# Altium footprint library ref-packages-longpad.PCBLIB: 1527 footprints (part 83 of 103) (continued)
## SQFP-S-44X44-576 [mm] (continued)
Top Overlay:
  circle w0.254: c-19.7,-20.2 r0.75
  lines w0.203: -21.77,-21.76 21.76,-21.76 21.76,21.76 -21.77,21.76 -21.77,-21.76
Mechanical 16:
  drawing of 580 lines, arcs and shapes, not listed
Mechanical 27:
  lines w0.2: -24.4,-24.4 -24.4,24.4 24.4,24.4 24.4,-24.4 -24.4,-24.4

## SSIP-32 [mil]
pads (32):
  round 60 hole 32: 1(-775,100) 2(-725,0) 3(-675,100) 4(-625,0) 5(-575,100) 6(-525,0) 7(-475,100) 8(-425,0) 9(-375,100) 10(-325,0) 11(-275,100) 12(-225,0) 13(-175,100) 14(-125,0) 15(-75,100) 16(-25,0) 17(25,100) 18(75,0) 19(125,100) 20(175,0) 21(225,100) 22(275,0) 23(325,100) 24(375,0) 25(425,100) 26(475,0) 27(525,100) 28(575,0) 29(625,100) 30(675,0) 31(725,100) 32(775,0)
Top Overlay:
  lines w8: -821,175 -821,190 -811,261 811,261 821,193 821,170 796,92
Mechanical 16:
  lines w1: -747,94 -747,259 ; -676,94 -676,257 ; 676,95 676,258 ; 747,94 747,259
  lines w8: -821,175 -796,92 796,92
  lines w22: -725,0 -725,85 ; -625,0 -625,85 ; -525,0 -525,85 ; -425,0 -425,85 ; -325,0 -325,85 ; -225,0 -225,85 ; -125,0 -125,85 ; -25,0 -25,85 ; 75,0 75,85 ; 175,0 175,85 ; 275,0 275,85 ; 375,0 375,85 ; 475,0 475,85 ; 575,0 575,85 ; 675,0 675,85 ; 775,0 775,85

## SSO48 [mm]
pads (48):
  rect 0.4x2.2 smd: 1(-7.303,-4.7) 2(-6.668,-4.7) 3(-6.033,-4.7) 4(-5.398,-4.7) 5(-4.763,-4.7) 6(-4.128,-4.7) 7(-3.493,-4.7) 8(-2.858,-4.7) 9(-2.223,-4.7) 10(-1.588,-4.7) 11(-0.953,-4.7) 12(-0.318,-4.7) 13(0.318,-4.7) 14(0.953,-4.7) 15(1.588,-4.7) 16(2.223,-4.7) 17(2.858,-4.7) 18(3.493,-4.7) 19(4.128,-4.7) 20(4.763,-4.7) 21(5.398,-4.7) 22(6.033,-4.7) 23(6.668,-4.7) 24(7.303,-4.7) 25(7.303,4.7) 26(6.668,4.7) 27(6.033,4.7) 28(5.398,4.7) 29(4.763,4.7) 30(4.128,4.7) 31(3.493,4.7) 32(2.858,4.7) 33(2.223,4.7) 34(1.588,4.7) 35(0.953,4.7) 36(0.318,4.7) 37(-0.318,4.7) 38(-0.953,4.7) 39(-1.588,4.7) 40(-2.223,4.7) 41(-2.858,4.7) 42(-3.493,4.7) 43(-4.128,4.7) 44(-4.763,4.7) 45(-5.398,4.7) 46(-6.033,4.7) 47(-6.668,4.7) 48(-7.303,4.7)
Mechanical 16:
  rectangle: -7.453,-5.33 -7.152,-3.8
  rectangle: -6.818,-5.33 -6.517,-3.8
  rectangle: -6.183,-5.33 -5.882,-3.8
  rectangle: -5.548,-5.33 -5.247,-3.8
  rectangle: -4.913,-5.33 -4.612,-3.8
  rectangle: -4.278,-5.33 -3.977,-3.8
  rectangle: -3.643,-5.33 -3.342,-3.8
  rectangle: -3.008,-5.33 -2.707,-3.8
  rectangle: -2.373,-5.33 -2.072,-3.8
  rectangle: -1.738,-5.33 -1.437,-3.8
  rectangle: -1.103,-5.33 -0.802,-3.8
  rectangle: -0.468,-5.33 -0.167,-3.8
  rectangle: 0.167,-5.33 0.468,-3.8
  rectangle: 0.802,-5.33 1.103,-3.8
  rectangle: 1.437,-5.33 1.738,-3.8
  rectangle: 2.072,-5.33 2.373,-3.8
  rectangle: 2.707,-5.33 3.008,-3.8
  rectangle: 3.342,-5.33 3.643,-3.8
  rectangle: 3.977,-5.33 4.278,-3.8
  rectangle: 4.612,-5.33 4.913,-3.8
  rectangle: 5.247,-5.33 5.548,-3.8
  rectangle: 5.882,-5.33 6.183,-3.8
  rectangle: 6.517,-5.33 6.818,-3.8
  rectangle: 7.152,-5.33 7.453,-3.8
  rectangle: 7.152,3.8 7.453,5.33
  rectangle: 6.517,3.8 6.818,5.33
  rectangle: 5.882,3.8 6.183,5.33
  rectangle: 5.247,3.8 5.548,5.33
  rectangle: 4.612,3.8 4.913,5.33
  rectangle: 3.977,3.8 4.278,5.33
  rectangle: 3.342,3.8 3.643,5.33
  rectangle: 2.707,3.8 3.008,5.33
  rectangle: 2.072,3.8 2.373,5.33
  rectangle: 1.437,3.8 1.738,5.33
  rectangle: 0.802,3.8 1.103,5.33
  rectangle: 0.167,3.8 0.468,5.33
  rectangle: -0.468,3.8 -0.167,5.33
  rectangle: -1.103,3.8 -0.802,5.33
  rectangle: -1.738,3.8 -1.437,5.33
  rectangle: -2.373,3.8 -2.072,5.33
  rectangle: -3.008,3.8 -2.707,5.33
  rectangle: -3.643,3.8 -3.342,5.33
  rectangle: -4.278,3.8 -3.977,5.33
  rectangle: -4.913,3.8 -4.612,5.33
  rectangle: -5.548,3.8 -5.247,5.33
  rectangle: -6.183,3.8 -5.882,5.33
  rectangle: -6.818,3.8 -6.517,5.33
  rectangle: -7.453,3.8 -7.152,5.33
  lines w0.203: -7.9,-3.2 -7.9,-3.7 7.9,-3.7 7.9,-3.2 ; -7.9,-3.2 -7.9,3.7 7.9,3.7 7.9,-3.2 ; -7.9,-3.2 7.9,-3.2
Mechanical 27:
  lines w0.2: -8.395,-5.9 8.395,-5.9 8.395,5.9 -8.395,5.9 -8.395,-5.9

## SSO56 [mm]
pads (56):
  rect 0.4x2.2 smd: 1(-8.573,-4.7) 2(-7.938,-4.7) 3(-7.303,-4.7) 4(-6.668,-4.7) 5(-6.033,-4.7) 6(-5.398,-4.7) 7(-4.763,-4.7) 8(-4.128,-4.7) 9(-3.493,-4.7) 10(-2.858,-4.7) 11(-2.223,-4.7) 12(-1.588,-4.7) 13(-0.953,-4.7) 14(-0.318,-4.7) 15(0.318,-4.7) 16(0.953,-4.7) 17(1.588,-4.7) 18(2.223,-4.7) 19(2.858,-4.7) 20(3.493,-4.7) 21(4.128,-4.7) 22(4.763,-4.7) 23(5.398,-4.7) 24(6.033,-4.7) 25(6.668,-4.7) 26(7.303,-4.7) 27(7.938,-4.7) 28(8.573,-4.7) 29(8.573,4.7) 30(7.938,4.7) 31(7.303,4.7) 32(6.668,4.7) 33(6.033,4.7) 34(5.398,4.7) 35(4.763,4.7) 36(4.128,4.7) 37(3.493,4.7) 38(2.858,4.7) 39(2.223,4.7) 40(1.588,4.7) 41(0.953,4.7) 42(0.318,4.7) 43(-0.318,4.7) 44(-0.953,4.7) 45(-1.588,4.7) 46(-2.223,4.7) 47(-2.858,4.7) 48(-3.493,4.7) 49(-4.128,4.7) 50(-4.763,4.7) 51(-5.398,4.7) 52(-6.033,4.7) 53(-6.668,4.7) 54(-7.303,4.7) 55(-7.938,4.7) 56(-8.573,4.7)
Mechanical 16:
  rectangle: -8.723,-5.33 -8.422,-3.8
  rectangle: -8.088,-5.33 -7.787,-3.8
  rectangle: -7.453,-5.33 -7.152,-3.8
  rectangle: -6.818,-5.33 -6.517,-3.8
  rectangle: -6.183,-5.33 -5.882,-3.8
  rectangle: -5.548,-5.33 -5.247,-3.8
  rectangle: -4.913,-5.33 -4.612,-3.8
  rectangle: -4.278,-5.33 -3.977,-3.8
  rectangle: -3.643,-5.33 -3.342,-3.8
  rectangle: -3.008,-5.33 -2.707,-3.8
  rectangle: -2.373,-5.33 -2.072,-3.8
  rectangle: -1.738,-5.33 -1.437,-3.8
  rectangle: -1.103,-5.33 -0.802,-3.8
  rectangle: -0.468,-5.33 -0.167,-3.8
  rectangle: 0.167,-5.33 0.468,-3.8
  rectangle: 0.802,-5.33 1.103,-3.8
  rectangle: 1.437,-5.33 1.738,-3.8
  rectangle: 2.072,-5.33 2.373,-3.8
  rectangle: 2.707,-5.33 3.008,-3.8
  rectangle: 3.342,-5.33 3.643,-3.8
  rectangle: 3.977,-5.33 4.278,-3.8
  rectangle: 4.612,-5.33 4.913,-3.8
  rectangle: 5.247,-5.33 5.548,-3.8
  rectangle: 5.882,-5.33 6.183,-3.8
  rectangle: 6.517,-5.33 6.818,-3.8
  rectangle: 7.152,-5.33 7.453,-3.8
  rectangle: 7.787,-5.33 8.088,-3.8
  rectangle: 8.422,-5.33 8.723,-3.8
  rectangle: 8.422,3.8 8.723,5.33
  rectangle: 7.787,3.8 8.088,5.33
  rectangle: 7.152,3.8 7.453,5.33
  rectangle: 6.517,3.8 6.818,5.33
  rectangle: 5.882,3.8 6.183,5.33
  rectangle: 5.247,3.8 5.548,5.33
  rectangle: 4.612,3.8 4.913,5.33
  rectangle: 3.977,3.8 4.278,5.33
  rectangle: 3.342,3.8 3.643,5.33
  rectangle: 2.707,3.8 3.008,5.33
  rectangle: 2.072,3.8 2.373,5.33
  rectangle: 1.437,3.8 1.738,5.33
  rectangle: 0.802,3.8 1.103,5.33
  rectangle: 0.167,3.8 0.468,5.33
  rectangle: -0.468,3.8 -0.167,5.33
  rectangle: -1.103,3.8 -0.802,5.33
  rectangle: -1.738,3.8 -1.437,5.33
  rectangle: -2.373,3.8 -2.072,5.33
  rectangle: -3.008,3.8 -2.707,5.33
  rectangle: -3.643,3.8 -3.342,5.33
  rectangle: -4.278,3.8 -3.977,5.33
  rectangle: -4.913,3.8 -4.612,5.33
  rectangle: -5.548,3.8 -5.247,5.33
  rectangle: -6.183,3.8 -5.882,5.33
  rectangle: -6.818,3.8 -6.517,5.33
  rectangle: -7.453,3.8 -7.152,5.33
  rectangle: -8.088,3.8 -7.787,5.33
  rectangle: -8.723,3.8 -8.422,5.33
  lines w0.203: -9.17,-3.2 -9.17,-3.7 9.17,-3.7 9.17,-3.2 ; -9.17,-3.2 -9.17,3.7 9.17,3.7 9.17,-3.2 ; -9.17,-3.2 9.17,-3.2
Mechanical 27:
  lines w0.2: -9.395,-5.9 9.395,-5.9 9.395,5.9 -9.395,5.9 -9.395,-5.9

## SSO64 [mm]
pads (64):
  rect 0.5x2 smd: 1(-12.4,-6.7) 2(-11.6,-6.7) 3(-10.8,-6.7) 4(-10,-6.7) 5(-9.2,-6.7) 6(-8.4,-6.7) 7(-7.6,-6.7) 8(-6.8,-6.7) 9(-6,-6.7) 10(-5.2,-6.7) 11(-4.4,-6.7) 12(-3.6,-6.7) 13(-2.8,-6.7) 14(-2,-6.7) 15(-1.2,-6.7) 16(-0.4,-6.7) 17(0.4,-6.7) 18(1.2,-6.7) 19(2,-6.7) 20(2.8,-6.7) 21(3.6,-6.7) 22(4.4,-6.7) 23(5.2,-6.7) 24(6,-6.7) 25(6.8,-6.7) 26(7.6,-6.7) 27(8.4,-6.7) 28(9.2,-6.7) 29(10,-6.7) 30(10.8,-6.7) 31(11.6,-6.7) 32(12.4,-6.7) 33(12.4,6.7) 34(11.6,6.7) 35(10.8,6.7) 36(10,6.7) 37(9.2,6.7) 38(8.4,6.7) 39(7.6,6.7) 40(6.8,6.7) 41(6,6.7) 42(5.2,6.7) 43(4.4,6.7) 44(3.6,6.7) 45(2.8,6.7) 46(2,6.7) 47(1.2,6.7) 48(0.4,6.7) 49(-0.4,6.7) 50(-1.2,6.7) 51(-2,6.7) 52(-2.8,6.7) 53(-3.6,6.7) 54(-4.4,6.7) 55(-5.2,6.7) 56(-6,6.7) 57(-6.8,6.7) 58(-7.6,6.7) 59(-8.4,6.7) 60(-9.2,6.7) 61(-10,6.7) 62(-10.8,6.7) 63(-11.6,6.7) 64(-12.4,6.7)
Mechanical 16:
  rectangle: -12.62,-7.25 -12.18,-6.05
  rectangle: -11.82,-7.25 -11.38,-6.05
  rectangle: -11.02,-7.25 -10.58,-6.05
  rectangle: -10.22,-7.25 -9.78,-6.05
  rectangle: -9.42,-7.25 -8.98,-6.05
  rectangle: -8.62,-7.25 -8.18,-6.05
  rectangle: -7.82,-7.25 -7.38,-6.05
  rectangle: -7.02,-7.25 -6.58,-6.05
  rectangle: -6.22,-7.25 -5.78,-6.05
  rectangle: -5.42,-7.25 -4.98,-6.05
  rectangle: -4.62,-7.25 -4.18,-6.05
  rectangle: -3.82,-7.25 -3.38,-6.05
  rectangle: -3.02,-7.25 -2.58,-6.05
  rectangle: -2.22,-7.25 -1.78,-6.05
  rectangle: -1.42,-7.25 -0.98,-6.05
  rectangle: -0.62,-7.25 -0.18,-6.05
  rectangle: 0.18,-7.25 0.62,-6.05
  rectangle: 0.98,-7.25 1.42,-6.05
  rectangle: 1.78,-7.25 2.22,-6.05
  rectangle: 2.58,-7.25 3.02,-6.05
  rectangle: 3.38,-7.25 3.82,-6.05
  rectangle: 4.18,-7.25 4.62,-6.05
  rectangle: 4.98,-7.25 5.42,-6.05
  rectangle: 5.78,-7.25 6.22,-6.05
  rectangle: 6.58,-7.25 7.02,-6.05
  rectangle: 7.38,-7.25 7.82,-6.05
  rectangle: 8.18,-7.25 8.62,-6.05
  rectangle: 8.98,-7.25 9.42,-6.05
  rectangle: 9.78,-7.25 10.22,-6.05
  rectangle: 10.58,-7.25 11.02,-6.05
  rectangle: 11.38,-7.25 11.82,-6.05
  rectangle: 12.18,-7.25 12.62,-6.05
  rectangle: 12.18,6.05 12.62,7.25
  rectangle: 11.38,6.05 11.82,7.25
  rectangle: 10.58,6.05 11.02,7.25
  rectangle: 9.78,6.05 10.22,7.25
  rectangle: 8.98,6.05 9.42,7.25
  rectangle: 8.18,6.05 8.62,7.25
  rectangle: 7.38,6.05 7.82,7.25
  rectangle: 6.58,6.05 7.02,7.25
  rectangle: 5.78,6.05 6.22,7.25
  rectangle: 4.98,6.05 5.42,7.25
  rectangle: 4.18,6.05 4.62,7.25
  rectangle: 3.38,6.05 3.82,7.25
  rectangle: 2.58,6.05 3.02,7.25
  rectangle: 1.78,6.05 2.22,7.25
  rectangle: 0.98,6.05 1.42,7.25
  rectangle: 0.18,6.05 0.62,7.25
  rectangle: -0.62,6.05 -0.18,7.25
  rectangle: -1.42,6.05 -0.98,7.25
  rectangle: -2.22,6.05 -1.78,7.25
  rectangle: -3.02,6.05 -2.58,7.25
  rectangle: -3.82,6.05 -3.38,7.25
  rectangle: -4.62,6.05 -4.18,7.25
  rectangle: -5.42,6.05 -4.98,7.25
  rectangle: -6.22,6.05 -5.78,7.25
  rectangle: -7.02,6.05 -6.58,7.25
  rectangle: -7.82,6.05 -7.38,7.25
  rectangle: -8.62,6.05 -8.18,7.25
  rectangle: -9.42,6.05 -8.98,7.25
  rectangle: -10.22,6.05 -9.78,7.25
  rectangle: -11.02,6.05 -10.58,7.25
  rectangle: -11.82,6.05 -11.38,7.25
  rectangle: -12.62,6.05 -12.18,7.25
  lines w0.203: -13.12,-5.06 -13.12,-5.96 13.12,-5.96 13.12,-5.06 ; -13.12,-5.06 -13.12,5.96 13.12,5.96 13.12,-5.06 ; -13.12,-5.06 13.12,-5.06
Mechanical 27:
  lines w0.2: -13.395,-7.9 13.395,-7.9 13.395,7.9 -13.395,7.9 -13.395,-7.9

## SSOP14 [mm]
pads (14):
  rect 0.4x1.5 smd: 1(-1.95,-3.625) 2(-1.3,-3.625) 3(-0.65,-3.625) 4(0,-3.625) 5(0.65,-3.625) 6(1.3,-3.625) 7(1.95,-3.625) 8(1.95,3.625) 9(1.3,3.625) 10(0.65,3.625) 11(0,3.625) 12(-0.65,3.625) 13(-1.3,3.625) 14(-1.95,3.625)
Top Overlay:
  rectangle: -2.6,-2.6 -1.625,2.6
  lines w0.203: -2.5,-2.6 2.5,-2.6 2.5,2.6 -2.5,2.6
Mechanical 16:
  rectangle: -2.128,-3.937 -1.772,-2.642
  rectangle: -1.478,-3.937 -1.122,-2.642
  rectangle: -0.828,-3.937 -0.472,-2.642
  rectangle: -0.178,-3.937 0.178,-2.642
  rectangle: 0.472,-3.937 0.828,-2.642
  rectangle: 1.122,-3.937 1.478,-2.642
  rectangle: 1.772,-3.937 2.128,-2.642
  rectangle: 1.772,2.642 2.128,3.937
  rectangle: 1.122,2.642 1.478,3.937
  rectangle: 0.472,2.642 0.828,3.937
  rectangle: -0.178,2.642 0.178,3.937
  rectangle: -0.828,2.642 -0.472,3.937
  rectangle: -1.478,2.642 -1.122,3.937
  rectangle: -2.128,2.642 -1.772,3.937

## SSOP16 [mil]
pads (16):
  rect 15.75x47.24 smd: 1(-89.57,-115.16) 2(-63.98,-115.16) 3(-38.39,-115.16) 4(-12.8,-115.16) 5(12.8,-115.16) 6(38.39,-115.16) 7(63.98,-115.16) 8(89.57,-115.16) 9(89.57,115.16) 10(63.98,115.16) 11(38.39,115.16) 12(12.8,115.16) 13(-12.8,115.16) 14(-38.39,115.16) 15(-63.98,115.16) 16(-89.57,115.16)
Top Overlay:
  circle w8: c-74.21,-58.86 r15.35
  lines w8: -101.1,-84.45 101.1,-84.45 101.1,84.45 -101.1,84.45 -101.1,-84.45
Mechanical 16:
  rectangle: -95.96,-130.51 -83.17,-88.29
  rectangle: -70.37,-130.51 -57.58,-88.29
  rectangle: -44.78,-130.51 -31.99,-88.29
  rectangle: -19.19,-130.51 -6.4,-88.29
  rectangle: 6.4,-130.51 19.19,-88.29
  rectangle: 31.99,-130.51 44.78,-88.29
  rectangle: 57.58,-130.51 70.37,-88.29
  rectangle: 83.17,-130.51 95.96,-88.29
  rectangle: 83.17,88.29 95.96,130.51
  rectangle: 57.58,88.29 70.37,130.51
  rectangle: 31.99,88.29 44.78,130.51
  rectangle: 6.4,88.29 19.19,130.51
  rectangle: -19.19,88.29 -6.4,130.51
  rectangle: -44.78,88.29 -31.99,130.51
  rectangle: -70.37,88.29 -57.58,130.51
  rectangle: -95.96,88.29 -83.17,130.51

## SSOP20 [mil]
pads (20):
  rect 12.01x49.02 smd: 1(-112.48,-130) 2(-87.48,-130) 3(-62.48,-130) 4(-37.48,-130) 5(-12.48,-130) 6(12.52,-130) 7(37.52,-130) 8(62.52,-130) 9(87.52,-130) 10(112.52,-130) 11(112.52,130) 12(87.52,130) 13(62.52,130) 14(37.52,130) 15(12.52,130) 16(-12.48,130) 17(-37.48,130) 18(-62.48,130) 19(-87.48,130) 20(-112.48,130)
Top Overlay:
  circle w6: c-92.48,-55 r25
  lines w2: -132.48,-90 132.52,-90 132.52,90 -132.48,90 -132.48,-90
  lines w6: -142.48,-100 142.52,-100 142.52,100 -142.48,100 -142.48,-100
Mechanical 16:
  rectangle: 108.52,102 116.52,135
  rectangle: 83.52,102 91.52,135
  rectangle: 58.52,102 66.52,135
  rectangle: 33.52,102 41.52,135
  rectangle: 8.52,102 16.52,135
  rectangle: -16.48,102 -8.48,135
  rectangle: -41.48,102 -33.48,135
  rectangle: -66.48,102 -58.48,135
  rectangle: -91.48,102 -83.48,135
  rectangle: -116.48,102 -108.48,135
  rectangle: -116.48,-135 -108.48,-102
  rectangle: -91.48,-135 -83.48,-102
  rectangle: -66.48,-135 -58.48,-102
  rectangle: -41.48,-135 -33.48,-102
  rectangle: -16.48,-135 -8.48,-102
  rectangle: 8.52,-135 16.52,-102
  rectangle: 33.52,-135 41.52,-102
  rectangle: 58.52,-135 66.52,-102
  rectangle: 83.52,-135 91.52,-102
  rectangle: 108.52,-135 116.52,-102

## SSOP20D8 [mil]
pads (20):
  rect 12x49 smd: 1(-110,-132) 2(-85,-132) 3(-60,-132) 4(-35,-132) 5(-10,-132) 6(15,-132) 7(40,-132) 8(65,-132) 9(90,-132) 10(115,-132) 11(115,128) 12(90,128) 13(65,128) 14(40,128) 15(15,128) 16(-10,128) 17(-35,128) 18(-60,128) 19(-85,128) 20(-110,128)
Top Overlay:
  circle w6: c-90,-57 r25
  lines w2: -130,-92.01 135,-92.01 135,87.99 -130,87.99 -130,-92.01
  lines w6: -140,-102.01 145,-102.01 145,97.99 -140,97.99 -140,-102.01
Mechanical 16:
  rectangle: 111,100 119,133
  rectangle: 86,100 94,133
  rectangle: 61,100 69,133
  rectangle: 36,100 44,133
  rectangle: 11,100 19,133
  rectangle: -14,100 -6,133
  rectangle: -39,100 -31,133
  rectangle: -64,100 -56,133
  rectangle: -89,100 -81,133
  rectangle: -114,100 -106,133
  rectangle: -114,-137 -106,-104
  rectangle: -89,-137 -81,-104
  rectangle: -64,-137 -56,-104
  rectangle: -39,-137 -31,-104
  rectangle: -14,-137 -6,-104
  rectangle: 11,-137 19,-104
  rectangle: 36,-137 44,-104
  rectangle: 61,-137 69,-104
  rectangle: 86,-137 94,-104
  rectangle: 111,-137 119,-104

## SSOP24 [mil]
pads (24):
  rect 15.75x47.24 smd: 1(-140.75,-134.65) 2(-115.16,-134.65) 3(-89.57,-134.65) 4(-63.98,-134.65) 5(-38.39,-134.65) 6(-12.8,-134.65) 7(12.8,-134.65) 8(38.39,-134.65) 9(63.98,-134.65) 10(89.57,-134.65) 11(115.16,-134.65) 12(140.75,-134.65) 13(140.75,134.65) 14(115.16,134.65) 15(89.57,134.65) 16(63.98,134.65) 17(38.39,134.65) 18(12.8,134.65) 19(-12.8,134.65) 20(-38.39,134.65) 21(-63.98,134.65) 22(-89.57,134.65) 23(-115.16,134.65) 24(-140.75,134.65)
Top Overlay:
  circle w6: c-113.5,-55 r25
  lines w2: -152.52,-90 152.52,-90 152.52,90 -152.52,90 -152.52,-90
  lines w6: -162.52,-99.84 162.52,-99.84 162.52,99.84 -162.52,99.84 -162.52,-99.84
Mechanical 16:
  rectangle: -146.65,-149.61 -134.84,-102.36
  rectangle: -121.06,-149.61 -109.25,-102.36
  rectangle: -95.47,-149.61 -83.66,-102.36
  rectangle: -69.88,-149.61 -58.07,-102.36
  rectangle: -44.29,-149.61 -32.48,-102.36
  rectangle: -18.7,-149.61 -6.89,-102.36
  rectangle: 6.89,-149.61 18.7,-102.36
  rectangle: 32.48,-149.61 44.29,-102.36
  rectangle: 58.07,-149.61 69.88,-102.36
  rectangle: 83.66,-149.61 95.47,-102.36
  rectangle: 109.25,-149.61 121.06,-102.36
  rectangle: 134.84,-149.61 146.65,-102.36
  rectangle: 134.84,102.36 146.65,149.61
  rectangle: 109.25,102.36 121.06,149.61
  rectangle: 83.66,102.36 95.47,149.61
  rectangle: 58.07,102.36 69.88,149.61
  rectangle: 32.48,102.36 44.29,149.61
  rectangle: 6.89,102.36 18.7,149.61
  rectangle: -18.7,102.36 -6.89,149.61
  rectangle: -44.29,102.36 -32.48,149.61
  rectangle: -69.88,102.36 -58.07,149.61
  rectangle: -95.47,102.36 -83.66,149.61
  rectangle: -121.06,102.36 -109.25,149.61
  rectangle: -146.65,102.36 -134.84,149.61

## SSOP28 [mil]
pads (28):
  rect 15.75x59.06 smd: 1(-166.34,-142.72) 2(-140.75,-142.72) 3(-115.16,-142.72) 4(-89.57,-142.72) 5(-63.98,-142.72) 6(-38.39,-142.72) 7(-12.8,-142.72) 8(12.8,-142.72) 9(38.39,-142.72) 10(63.98,-142.72) 11(89.57,-142.72) 12(115.16,-142.72) 13(140.75,-142.72) 14(166.34,-142.72) 15(166.34,142.72) 16(140.75,142.72) 17(115.16,142.72) 18(89.57,142.72) 19(63.98,142.72) 20(38.39,142.72) 21(12.8,142.72) 22(-12.8,142.72) 23(-38.39,142.72) 24(-63.98,142.72) 25(-89.57,142.72) 26(-115.16,142.72) 27(-140.75,142.72) 28(-166.34,142.72)
Top Overlay:
  rectangle: -204.72,-102.36 -166.34,102.36
  lines w8: -200.79,-102.36 200.79,-102.36 200.79,102.36 -200.79,102.36
Mechanical 16:
  rectangle: -173.34,-155 -159.34,-104
  rectangle: -147.75,-155 -133.75,-104
  rectangle: -122.16,-155 -108.16,-104
  rectangle: -96.57,-155 -82.57,-104
  rectangle: -70.98,-155 -56.98,-104
  rectangle: -45.39,-155 -31.39,-104
  rectangle: -19.8,-155 -5.8,-104
  rectangle: 5.8,-155 19.8,-104
  rectangle: 31.39,-155 45.39,-104
  rectangle: 56.98,-155 70.98,-104
  rectangle: 82.57,-155 96.57,-104
  rectangle: 108.16,-155 122.16,-104
  rectangle: 133.75,-155 147.75,-104
  rectangle: 159.34,-155 173.34,-104
  rectangle: 159.34,104 173.34,155
  rectangle: 133.75,104 147.75,155
  rectangle: 108.16,104 122.16,155
  rectangle: 82.57,104 96.57,155
  rectangle: 56.98,104 70.98,155
  rectangle: 31.39,104 45.39,155
  rectangle: 5.8,104 19.8,155
  rectangle: -19.8,104 -5.8,155
  rectangle: -45.39,104 -31.39,155
  rectangle: -70.98,104 -56.98,155
  rectangle: -96.57,104 -82.57,155
  rectangle: -122.16,104 -108.16,155
  rectangle: -147.75,104 -133.75,155
  rectangle: -173.34,104 -159.34,155

## SSOP28DB [mil]
pads (28):
  rect 13.7x55 smd: 1(-166.34,-143.94) 2(-140.75,-143.94) 3(-115.16,-143.94) 4(-89.57,-143.94) 5(-63.98,-143.94) 6(-38.39,-143.94) 7(-12.8,-143.94) 8(12.8,-143.94) 9(38.39,-143.94) 10(63.98,-143.94) 11(89.57,-143.94) 12(115.16,-143.94) 13(140.75,-143.94) 14(166.34,-143.94) 15(166.34,143.94) 16(140.75,143.94) 17(115.16,143.94) 18(89.57,143.94) 19(63.98,143.94) 20(38.39,143.94) 21(12.8,143.94) 22(-12.8,143.94) 23(-38.39,143.94) 24(-63.98,143.94) 25(-89.57,143.94) 26(-115.16,143.94) 27(-140.75,143.94) 28(-166.34,143.94)
Top Overlay:
  circle w6: c-166.34,-76.77 r18.09
  lines w2: -198.35,-108.78 198.35,-108.78 198.35,108.78 -198.35,108.78 -198.35,-108.78
  lines w6: -204.72,-115.16 204.72,-115.16 204.72,115.16 -204.72,115.16 -204.72,-115.16
Mechanical 16:
  rectangle: -172.74,116.76 -159.94,153.54
  rectangle: -172.74,-153.54 -159.94,-116.76
  rectangle: -147.15,-153.54 -134.35,-116.76
  rectangle: -121.56,-153.54 -108.76,-116.76
  rectangle: -147.15,116.76 -134.35,153.54
  rectangle: -121.56,116.76 -108.76,153.54
  rectangle: -95.96,116.76 -83.17,153.54
  rectangle: -70.37,116.76 -57.58,153.54
  rectangle: -44.78,116.76 -31.99,153.54
  rectangle: -19.19,116.76 -6.4,153.54
  rectangle: 6.4,116.76 19.19,153.54
  rectangle: 31.99,116.76 44.78,153.54
  rectangle: 57.58,116.76 70.37,153.54
  rectangle: 83.17,116.76 95.96,153.54
  rectangle: 108.76,116.76 121.56,153.54
  rectangle: 134.35,116.76 147.15,153.54
  rectangle: 159.94,116.76 172.74,153.54
  rectangle: -95.96,-153.54 -83.17,-116.76
  rectangle: -70.37,-153.54 -57.58,-116.76
  rectangle: -44.78,-153.54 -31.99,-116.76
  rectangle: -19.19,-153.54 -6.4,-116.76
  rectangle: 6.4,-153.54 19.19,-116.76
  rectangle: 31.99,-153.54 44.78,-116.76
  rectangle: 57.58,-153.54 70.37,-116.76
  rectangle: 83.17,-153.54 95.96,-116.76
  rectangle: 108.76,-153.54 121.56,-116.76
  rectangle: 134.35,-153.54 147.15,-116.76
  rectangle: 159.94,-153.54 172.74,-116.76

## SSOP28DL [mil]
pads (28):
  rect 12x55 smd: 1(-162.5,-172.5) 2(-137.5,-172.5) 3(-112.5,-172.5) 4(-87.5,-172.5) 5(-62.5,-172.5) 6(-37.5,-172.5) 7(-12.5,-172.5) 8(12.5,-172.5) 9(37.5,-172.5) 10(62.5,-172.5) 11(87.5,-172.5) 12(112.5,-172.5) 13(137.5,-172.5) 14(162.5,-172.5) 15(162.5,172.5) 16(137.5,172.5) 17(112.5,172.5) 18(87.5,172.5) 19(62.5,172.5) 20(37.5,172.5) 21(12.5,172.5) 22(-12.5,172.5) 23(-37.5,172.5) 24(-62.5,172.5) 25(-87.5,172.5) 26(-112.5,172.5) 27(-137.5,172.5) 28(-162.5,172.5)
Top Overlay:
  circle w6: c-127.5,-92.5 r25
  lines w2: -177.52,-132.52 177.52,-132.52 177.52,132.52 -177.52,132.52 -177.52,-132.52
  lines w6: -187.52,-142.52 187.52,-142.52 187.52,142.52 -187.52,142.52 -187.52,-142.52
Mechanical 16:
  rectangle: -166.5,144.5 -158.5,177.5
  rectangle: -141.5,144.5 -133.5,177.5
  rectangle: -116.5,144.5 -108.5,177.5
  rectangle: -91.5,144.5 -83.5,177.5
  rectangle: -66.5,144.5 -58.5,177.5
  rectangle: -41.5,144.5 -33.5,177.5
  rectangle: -16.5,144.5 -8.5,177.5
  rectangle: 8.5,144.5 16.5,177.5
  rectangle: 33.5,144.5 41.5,177.5
  rectangle: 58.5,144.5 66.5,177.5
  rectangle: 83.5,144.5 91.5,177.5
  rectangle: 108.5,144.5 116.5,177.5
  rectangle: 133.5,144.5 141.5,177.5
  rectangle: 158.5,144.5 166.5,177.5
  rectangle: 158.5,-177.5 166.5,-144.5
  rectangle: 133.5,-177.5 141.5,-144.5
  rectangle: 108.5,-177.5 116.5,-144.5
  rectangle: 83.5,-177.5 91.5,-144.5
  rectangle: 58.5,-177.5 66.5,-144.5
  rectangle: 33.5,-177.5 41.5,-144.5
  rectangle: 8.5,-177.5 16.5,-144.5
  rectangle: -16.5,-177.5 -8.5,-144.5
  rectangle: -41.5,-177.5 -33.5,-144.5
  rectangle: -66.5,-177.5 -58.5,-144.5
  rectangle: -91.5,-177.5 -83.5,-144.5
  rectangle: -116.5,-177.5 -108.5,-144.5
  rectangle: -141.5,-177.5 -133.5,-144.5
  rectangle: -166.5,-177.5 -158.5,-144.5